# Altium footprint library LongMen.PcbLib: 245 footprints (part 10 of 16)
Each footprint in its own frame and in the unit in brackets; x right, y up, seen from the top. Pads: shape width x height; smd on the part's side, far side on the other; paste and mask are expansions set on the pad; w line width, h text height; cw(c..) or ccw(c..) is an arc to the next point about the centre after c.
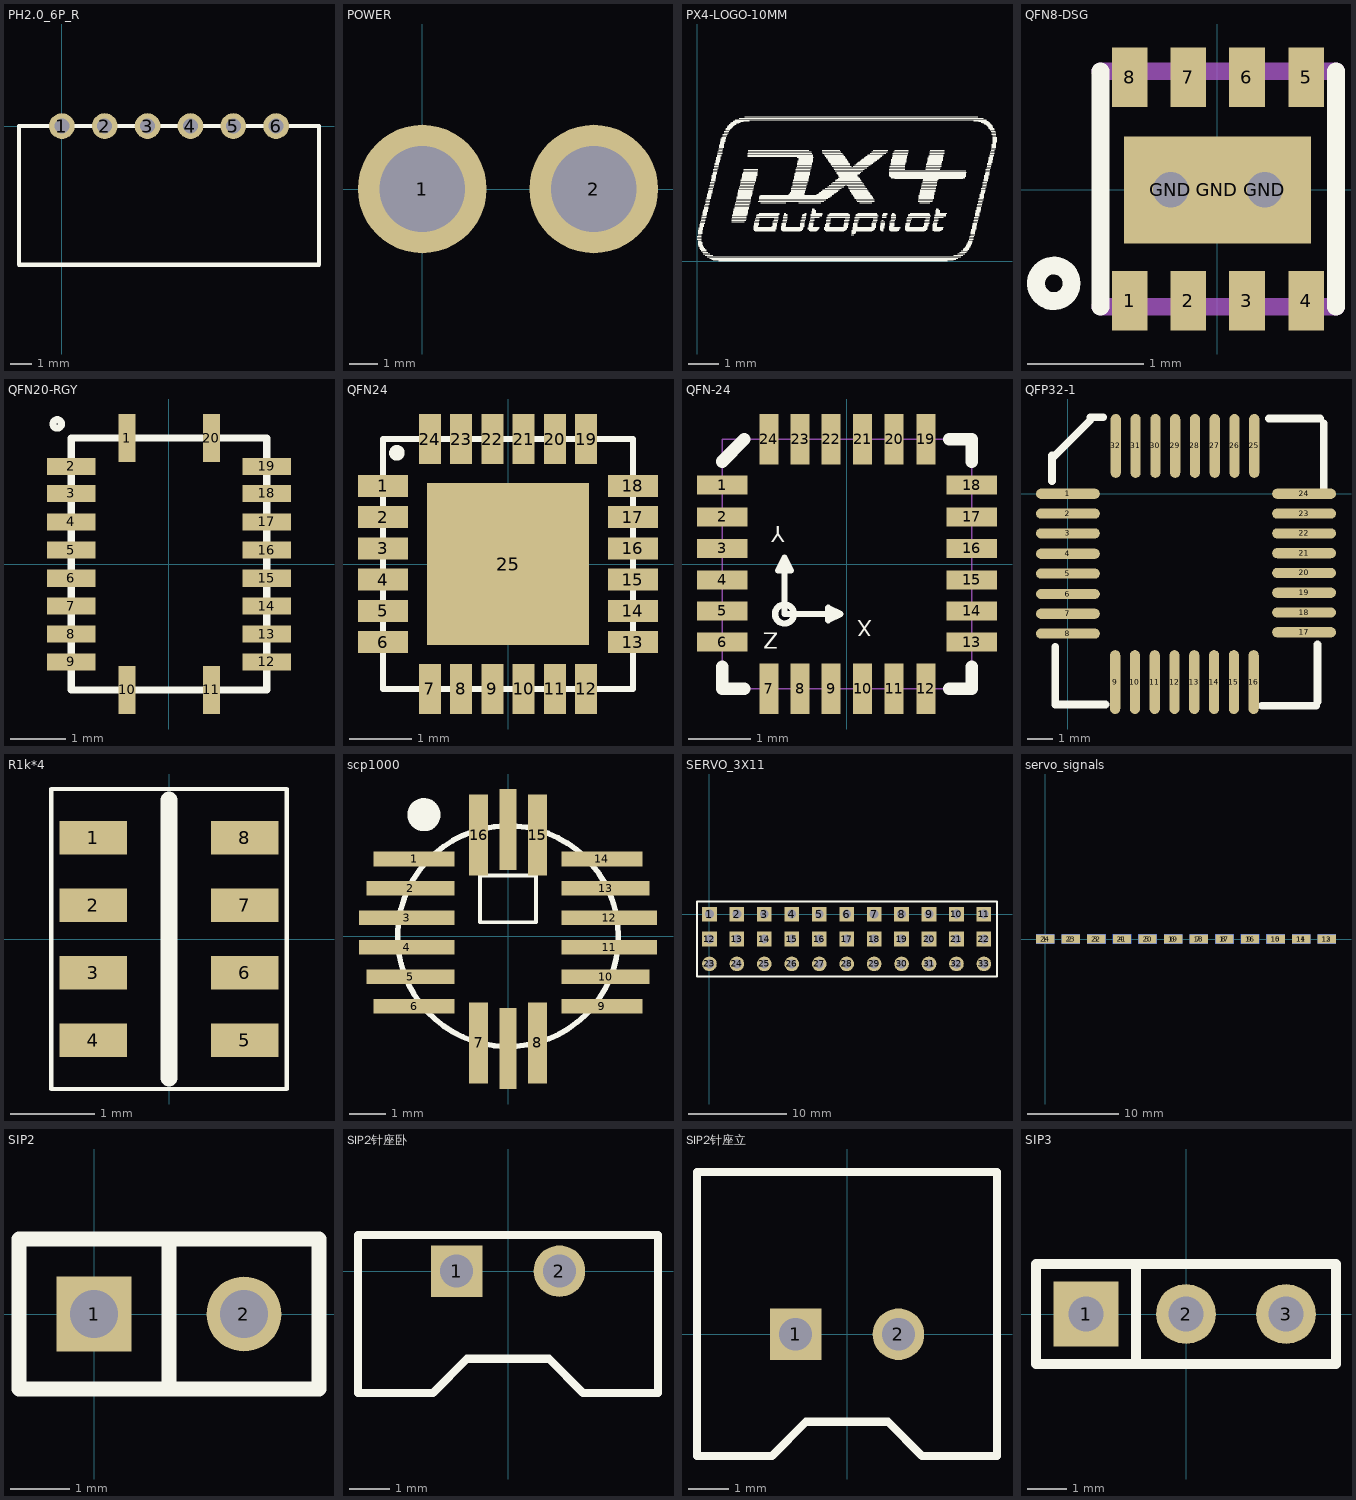
[diagram p9: the footprints below, top view; thin cyan lines are the x and y axes]

## PH2.0_6P_R [mm]
pads (6):
  round 1.2 hole 0.7: 1(0,0) 2(2,0) 3(4,0) 4(6,0) 5(8,0) 6(10,0)
Top Overlay:
  lines w0.2: -2,-6.477 -2,0 12,0 12,-6.477 -2,-6.477
3D body: height 4.8, standoff -3.15, extent -2,-6.45 12,0.25

## POWER [mm]
pads (2):
  round 4.5 hole 3: 1(0,0) 2(6,0)

## PX4-LOGO-10MM [mm]
Top Overlay:
  drawing of 1018 lines, arcs and shapes, not listed

## QFN8-DSG [mil] "QFN8-DSG"
pads (11):
  rect 12x20 smd: 1(-29.53,-37.4) 2(-9.84,-37.4) 3(10,-37.4) 4(30,-37.4) 5(30,38) 6(10,38) 7(-9.84,38) 8(-29.53,38)
  rect 18x18 hole 12: GND(-15.75,0) GND(16,0)
  rect 63x36 smd: GND(0,0)
Top Overlay:
  circle w6: c-55.12,-31.5 r6
  lines w6: -39.37,-39.37 -39.37,40 ; 40,-39.37 40,40
Mechanical 16:
  lines w6: -39.37,-39.37 40,-39.37 ; -39.37,40 40,40
3D body: height 33.46, standoff 0, extent -39.37,-39.76 39.37,39.76

## QFN20-RGY [mil] "QFN20-RGY"
pads (20):
  rect 12x34 smd: 1(-29.53,89) 10(-29.53,-88.58) 11(30,-88.58) 20(30,89)
  rect 34x12 smd: 2(-68.9,69) 3(-68.9,50) 4(-68.9,30) 5(-68.9,10) 6(-68.9,-9.84) 7(-68.9,-29.53) 8(-68.9,-49.21) 9(-68.9,-68.9) 12(69,-68.9) 13(69,-49.21) 14(69,-29.53) 15(69,-9.84) 16(69,10) 17(69,30) 18(69,50) 19(69,69)
Top Overlay:
  circle w5: c-78.74,99 r3
  lines w5: -68.9,-88.58 69,-88.58 69,89 -68.9,89 -68.9,-88.58
3D body: height 39.37, standoff 0, extent -71.85,-91.53 71.85,91.54

## QFN24 [mm]
height 1.2
pads (25):
  rect 0.8x0.35 smd: 1(-2,1.25) 2(-2,0.75) 3(-2,0.25) 4(-2,-0.25) 5(-2,-0.75) 6(-2,-1.25) 13(2,-1.25) 14(2,-0.75) 15(2,-0.25) 16(2,0.25) 17(2,0.75) 18(2,1.25)
  rect 0.35x0.8 smd: 7(-1.25,-2) 8(-0.75,-2) 9(-0.25,-2) 10(0.25,-2) 11(0.75,-2) 12(1.25,-2) 19(1.25,2) 20(0.75,2) 21(0.25,2) 22(-0.25,2) 23(-0.75,2) 24(-1.25,2)
  rect 2.6x2.6 smd: 25(0,0)
Top Overlay:
  circle w0.15: c-1.778,1.778 r0.05
  lines w0.1: -2,-2 2,-2 2,2 -2,2 -2,-2
3D body: height 1.2, standoff 0, extent -2.05,-2.05 2.05,2.05

## QFN-24 [mil] "QFN-24"
pads (24):
  rect 32x12 smd: 1(-78.74,50) 2(-78.74,30) 3(-78.74,10) 4(-78.74,-9.84) 5(-78.74,-29.53) 6(-78.74,-49.21) 13(79,-49.21) 14(79,-29.53) 15(79,-9.84) 16(79,10) 17(79,30) 18(79,50)
  rect 12x32 smd: 7(-49.21,-78.74) 8(-29.53,-78.74) 9(-9.84,-78.74) 10(10,-78.74) 11(30,-78.74) 12(50,-78.74) 19(50,79) 20(30,79) 21(10,79) 22(-9.84,79) 23(-29.53,79) 24(-49.21,79)
Top Overlay:
  circle w4: c-39.37,-31.5 r6
  lines w4: -39.37,4 -35.43,-3.94 -43.31,-3.94 -39.37,4 ; -39.37,4 -39.37,-31.5 -3.94,-31.5 ; -3.94,-31.5 -11.81,-27.56 -11.81,-35.43 -3.94,-31.5
  lines w8: -78.74,-64.96 -78.74,-78.74 -64.96,-78.74 ; -78.74,65 -64.96,79 ; 65,-78.74 79,-78.74 79,-64.96 ; 65,79 79,79 79,65
  text "Z" at -43.31,-43.31 h10.2
  text "Y" at -39.37,24 h10.2
  text "X" at 16,-35.43 h10.2
Mechanical 16:
  lines w1: -78.74,-78.74 79,-78.74 79,79 -78.74,79 -78.74,-78.74
3D body: height 35.43, standoff 0, extent -78.82,-78.82 78.82,78.82

## QFP32-1 [mil]
pads (32):
  oval 100x16 smd: 1(0,0) 2(0,-31) 3(0,-62) 4(0,-94) 5(0,-125) 6(0,-157) 7(0,-188) 8(0,-219) 17(370,-217) 18(370,-186) 19(370,-155) 20(370,-124) 21(370,-93) 22(370,-62) 23(370,-31) 24(370,0)
  oval 16x100 smd: 9(74,-295) 10(105,-295) 11(136,-295) 12(167,-295) 13(198,-295) 14(229,-295) 15(260,-295) 16(291,-295) 25(292,75) 26(261,75) 27(230,75) 28(199,75) 29(168,75) 30(137,75) 31(106,75) 32(75,75)
Top Overlay:
  lines w12: -25,20 -25,60 ; -25,55 35,115 ; -20,-330 -20,-240 ; -16,-330 59,-330 ; 35,120 55,120 ; 304,-332 389,-332 ; 315,118 395,118 ; 391,-326 391,-236 ; 401,0 401,110

## R1k*4 [mm]
pads (8):
  rect 0.8x0.4 smd: 1(-0.9,1.2) 2(-0.9,0.4) 3(-0.9,-0.4) 4(-0.9,-1.2) 5(0.9,-1.2) 6(0.9,-0.4) 7(0.9,0.4) 8(0.9,1.2)
Top Overlay:
  lines w0.05: -1.397,-1.778 1.397,-1.778 1.397,1.778 -1.397,1.778 -1.397,-1.778
  lines w0.2: 0,-1.651 0,1.651
3D body: height 1, standoff 0, extent -1.066,-1.574 1.066,1.574

## scp1000 [mm]
pads (18):
  rect 2.2x0.4 smd: 1(-2.55,2.1) 6(-2.55,-1.9) 9(2.55,-1.9) 14(2.55,2.1)
  rect 2.4x0.4 smd: 2(-2.65,1.3) 5(-2.65,-1.1) 10(2.65,-1.1) 13(2.65,1.3)
  rect 2.6x0.4 smd: 3(-2.75,0.5) 4(-2.75,-0.3) 11(2.75,-0.3) 12(2.75,0.5)
  rect 0.52x2.2 smd: 7(-0.8,-2.9) 8(0.8,-2.9) 15(0.8,2.75) 16(-0.8,2.75)
  rect 0.45x2.2 smd: ""(0,-3.05) ""(0,2.9)
Top Overlay:
  circle w0.54: c-2.286,3.302 r0.18
  lines w0.1: -0.762,0.381 0.762,0.381 0.762,1.651 -0.762,1.651 -0.762,0.381
  lines w0.15: 3,0.005 cw(c0,0) 3,0.006

## SERVO_3X11 [mm]
pads (33):
  rect 1.5x1.5 hole 0.9: 1(0,0) 2(2.8,0) 3(5.6,0) 4(8.4,0) 5(11.2,0) 6(14,0) 7(16.8,0) 8(19.6,0) 9(22.4,0) 10(25.2,0) 11(28,0) 12(0,-2.54) 13(2.8,-2.54) 14(5.6,-2.54) 15(8.4,-2.54) 16(11.2,-2.54) 17(14,-2.54) 18(16.8,-2.54) 19(19.6,-2.54) 20(22.4,-2.54) 21(25.2,-2.54) 22(28,-2.54)
  round 1.5 hole 0.9: 23(0,-5.08) 24(2.8,-5.08) 25(5.6,-5.08) 26(8.4,-5.08) 27(11.2,-5.08) 28(14,-5.08) 29(16.8,-5.08) 30(19.6,-5.08) 31(22.4,-5.08) 32(25.2,-5.08) 33(28,-5.08)
Top Overlay:
  lines w0.2: -1.27,-6.35 -1.27,1.27 29.337,1.27 29.337,-6.35 -1.27,-6.35

## servo_signals [mm]
pads (24):
  rect 2x1 smd: 1(0,0) 2(2.8,0) 3(5.6,0) 4(8.4,0) 5(11.2,0) 6(14,0) 7(16.8,0) 8(19.6,0) 9(22.4,0) 10(25.2,0) 11(28,0) 12(30.8,0)
  rect 2x1 smd far side: 13(30.8,0) 14(28,0) 15(25.2,0) 16(22.4,0) 17(19.6,0) 18(16.8,0) 19(14,0) 20(11.2,0) 21(8.4,0) 22(5.6,0) 23(2.8,0) 24(0,0)

## SIP2 [mil]
pads (2):
  rect 50x50 hole 32: 1(0,0)
  round 50 hole 32: 2(100,0)
Top Overlay:
  lines w10: 50,-50 50,50 ; -50,-50 -50,50 150,50 150,-50 -50,-50

## SIP2针座卧 [mil]
pads (2):
  rect 50x50 hole 32: 1(-50,0)
  round 50 hole 32: 2(50,0)
Top Overlay:
  lines w7.87: -145.67,-118.11 -145.67,35 145.67,35 145.67,-118.11 72.83,-118.11 39.72,-85 -39.72,-85 -72.83,-118.11 -145.67,-118.11

## SIP2针座立 [mil]
pads (2):
  rect 50x50 hole 32: 1(-50,0)
  round 50 hole 32: 2(50,0)
Top Overlay:
  lines w7.87: -145.67,-118.11 -145.67,157.48 145.67,157.48 145.67,-118.11 72.83,-118.11 39.72,-85 -39.72,-85 -72.83,-118.11 -145.67,-118.11

## SIP3 [mil]
pads (3):
  rect 65x65 hole 35: 1(-100,0)
  round 60 hole 35: 2(0,0) 3(100,0)
Top Overlay:
  lines w10: -50,-50 -50,50 ; -150,-50 -150,50 150,50 150,-50 -150,-50